# Altium footprint library ICs And Semiconductors SMD_BGA.PcbLib: 118 footprints (part 2 of 17)
Each footprint in its own frame and in the unit in brackets; x right, y up, seen from the top. Pads: shape width x height; smd on the part's side, far side on the other; paste and mask are expansions set on the pad; w line width, h text height; cw(c..) or ccw(c..) is an arc to the next point about the centre after c.
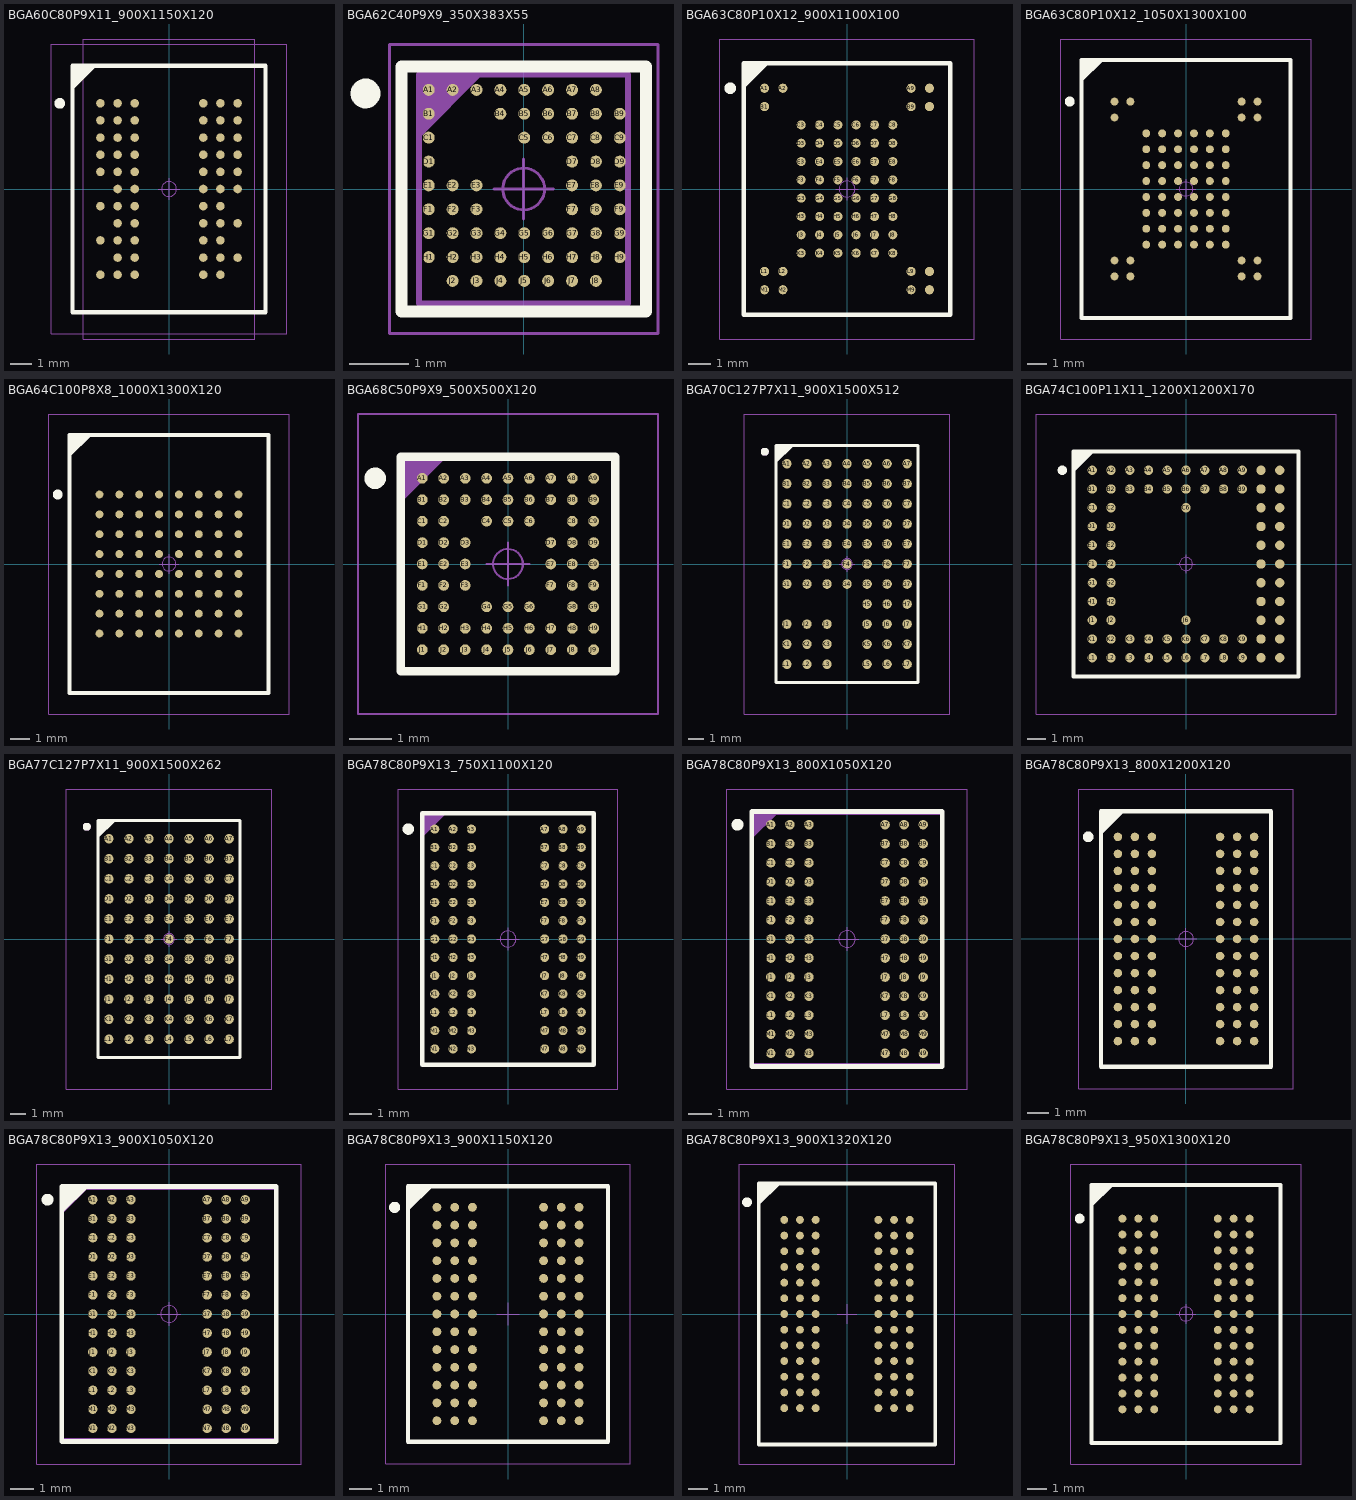
[diagram p1: the footprints below, top view; thin cyan lines are the x and y axes]

## BGA60C80P9X11_900X1150X120 [mm] "BGA, 0.80mm pitch, Rect.; 60 Pin, 9 Columns X 11 Rows, 9.00mm X 11.50mm X 1.20mm H"
height 1.2
pads (60):
  round 0.4 smd: A1(-3.2,4) A2(-2.4,4) A3(-1.6,4) A7(1.6,4) A8(2.4,4) A9(3.2,4) B1(-3.2,3.2) B2(-2.4,3.2) B3(-1.6,3.2) B7(1.6,3.2) B8(2.4,3.2) B9(3.2,3.2) C1(-3.2,2.4) C2(-2.4,2.4) C3(-1.6,2.4) C7(1.6,2.4) C8(2.4,2.4) C9(3.2,2.4) D1(-3.2,1.6) D2(-2.4,1.6) D3(-1.6,1.6) D7(1.6,1.6) D8(2.4,1.6) D9(3.2,1.6) E1(-3.2,0.8) E2(-2.4,0.8) E3(-1.6,0.8) E7(1.6,0.8) E8(2.4,0.8) E9(3.2,0.8) F2(-2.4,0) F3(-1.6,0) F7(1.6,0) F8(2.4,0) F9(3.2,0) G1(-3.2,-0.8) G2(-2.4,-0.8) G3(-1.6,-0.8) G7(1.6,-0.8) G8(2.4,-0.8) H2(-2.4,-1.6) H3(-1.6,-1.6) H7(1.6,-1.6) H8(2.4,-1.6) H9(3.2,-1.6) J1(-3.2,-2.4) J2(-2.4,-2.4) J3(-1.6,-2.4) J7(1.6,-2.4) J8(2.4,-2.4) K2(-2.4,-3.2) K3(-1.6,-3.2) K7(1.6,-3.2) K8(2.4,-3.2) K9(3.2,-3.2) L1(-3.2,-4) L2(-2.4,-4) L3(-1.6,-4) L7(1.6,-4) L8(2.4,-4)
Top Overlay:
  circle w0.25: c-5.1,3.998 r0.125
  lines w0.2: -4.5,4.748 -3.5,5.748 ; -4.5,4.948 -3.7,5.748 ; -4.5,5.148 -3.9,5.748 ; -4.5,5.348 -4.1,5.748 ; -4.5,5.548 -4.3,5.748 ; -4.5,-5.752 4.5,-5.752 4.5,5.748 -4.5,5.748 -4.5,-5.752
Mechanical 14:
  lines w0.1: -4.5,4.748 -3.5,5.748 ; -4.5,4.848 -3.6,5.748 ; -4.5,4.948 -3.7,5.748 ; -4.5,5.048 -3.8,5.748 ; -4.5,5.148 -3.9,5.748 ; -4.5,5.248 -4,5.748 ; -4.5,5.348 -4.1,5.748 ; -4.5,5.448 -4.2,5.748 ; -4.5,5.548 -4.3,5.748 ; -4.5,5.648 -4.4,5.748 ; -4.5,-5.752 4.5,-5.752 4.5,5.748 -4.5,5.748 -4.5,-5.752
  text "9" at 3.175,6.025 h0.4
  text "8" at 2.375,6.025 h0.4
  text "7" at 1.575,6.025 h0.4
  text "3" at -1.625,6.025 h0.4
  text "2" at -2.425,6.025 h0.4
  text "1" at -3.225,6.025 h0.4
  text "J" at -5.2,-2.425 h0.4
  text "B" at -5.2,3.175 h0.4
  text "C" at -5.2,2.375 h0.4
  text "D" at -5.2,1.575 h0.4
  text "E" at -5.2,0.775 h0.4
  text "F" at -5.2,-0.025 h0.4
  text "G" at -5.2,-0.825 h0.4
  text "H" at -5.2,-1.625 h0.4
  text "K" at -5.2,-3.225 h0.4
  text "L" at -5.2,-4.025 h0.4
  text "A" at -5.2,3.975 h0.4
Mechanical 15:
  circle w0.05: c0,-0.002 r0.35
  lines w0.05: -0.5,-0.002 0.5,-0.002 ; 0,-0.502 0,0.498 ; -5.5,-6.752 5.5,-6.752 5.5,6.748 -5.5,6.748 -5.5,-6.752
Mechanical 21:
  lines w0.001: -4,-7 -4,7 4,7 4,-7 -4,-7
3D body "BGA60C80P9X11_900X1150X120.stp": height 1.2, standoff 0, extent -4.5,-5.75 4.5,5.75

## BGA62C40P9X9_350X383X55 [mm] "BGA, 0.40mm Pitch, Rect.; 62 Pin, 9 Columns X 9 Rows, 3.50mm X 3.83mm X 0.55mm H"
height 0.55
pads (62):
  round 0.2 smd: A1(-1.59,1.66) A2(-1.19,1.66) A3(-0.79,1.66) A4(-0.39,1.66) A5(0.01,1.66) A6(0.41,1.66) A7(0.81,1.66) A8(1.21,1.66) B1(-1.59,1.26) B4(-0.39,1.26) B5(0.01,1.26) B6(0.41,1.26) B7(0.81,1.26) B8(1.21,1.26) B9(1.61,1.26) C1(-1.59,0.86) C5(0.01,0.86) C6(0.41,0.86) C7(0.81,0.86) C8(1.21,0.86) C9(1.61,0.86) D1(-1.59,0.46) D7(0.81,0.46) D8(1.21,0.46) D9(1.61,0.46) E1(-1.59,0.06) E2(-1.19,0.06) E3(-0.79,0.06) E7(0.81,0.06) E8(1.21,0.06) E9(1.61,0.06) F1(-1.59,-0.34) F2(-1.19,-0.34) F3(-0.79,-0.34) F7(0.81,-0.34) F8(1.21,-0.34) F9(1.61,-0.34) G1(-1.59,-0.74) G2(-1.19,-0.74) G3(-0.79,-0.74) G4(-0.39,-0.74) G5(0.01,-0.74) G6(0.41,-0.74) G7(0.81,-0.74) G8(1.21,-0.74) G9(1.61,-0.74) H1(-1.59,-1.14) H2(-1.19,-1.14) H3(-0.79,-1.14) H4(-0.39,-1.14) H5(0.01,-1.14) H6(0.41,-1.14) H7(0.81,-1.14) H8(1.21,-1.14) H9(1.61,-1.14) J2(-1.19,-1.54) J3(-0.79,-1.54) J4(-0.39,-1.54) J5(0.01,-1.54) J6(0.41,-1.54) J7(0.81,-1.54) J8(1.21,-1.54)
Top Overlay:
  circle w0.25: c-2.65,1.6 r0.125
  lines w0.2: -2.05,-2.05 2.05,-2.05 2.05,2.05 -2.05,2.05 -2.05,-2.05
Mechanical 14:
  lines w0.1: -1.75,0.92 -0.75,1.92 ; -1.75,1.02 -0.85,1.92 ; -1.75,1.12 -0.95,1.92 ; -1.75,1.22 -1.05,1.92 ; -1.75,1.32 -1.15,1.92 ; -1.75,1.42 -1.25,1.92 ; -1.75,1.52 -1.35,1.92 ; -1.75,1.62 -1.45,1.92 ; -1.75,1.72 -1.55,1.92 ; -1.75,1.82 -1.65,1.92 ; -1.75,-1.915 -1.75,1.915 1.75,1.915 1.75,-1.915 -1.75,-1.915
Mechanical 15:
  circle w0.05: c0,0 r0.35
  lines w0.05: -0.5,0 0.5,0 ; 0,-0.5 0,0.5 ; -2.25,-2.42 -2.25,2.42 2.25,2.42 2.25,-2.42 -2.25,-2.42
3D body "BGA62C40P9X9_350X383X55.stp": height 0.55, standoff 0, extent -1.775,-1.94 1.775,1.94

## BGA63C80P10X12_900X1100X100 [mm] "BGA, 0.80mm pitch, Rect.; 63 Pin, 10 Columns X 12 Rows, 9.00mm X 11.00mm X 1.00mm H"
height 1
pads (63):
  round 0.4 smd: A1(-3.6,4.4) A2(-2.8,4.4) A9(2.8,4.4) A10(3.6,4.4) B1(-3.6,3.6) B9(2.8,3.6) B10(3.6,3.6) C3(-2,2.8) C4(-1.2,2.8) C5(-0.4,2.8) C6(0.4,2.8) C7(1.2,2.8) C8(2,2.8) D3(-2,2) D4(-1.2,2) D5(-0.4,2) D6(0.4,2) D7(1.2,2) D8(2,2) E3(-2,1.2) E4(-1.2,1.2) E5(-0.4,1.2) E6(0.4,1.2) E7(1.2,1.2) E8(2,1.2) F3(-2,0.4) F4(-1.2,0.4) F5(-0.4,0.4) F6(0.4,0.4) F7(1.2,0.4) F8(2,0.4) G3(-2,-0.4) G4(-1.2,-0.4) G5(-0.4,-0.4) G6(0.4,-0.4) G7(1.2,-0.4) G8(2,-0.4) H3(-2,-1.2) H4(-1.2,-1.2) H5(-0.4,-1.2) H6(0.4,-1.2) H7(1.2,-1.2) H8(2,-1.2) J3(-2,-2) J4(-1.2,-2) J5(-0.4,-2) J6(0.4,-2) J7(1.2,-2) J8(2,-2) K3(-2,-2.8) K4(-1.2,-2.8) K5(-0.4,-2.8) K6(0.4,-2.8) K7(1.2,-2.8) K8(2,-2.8) L1(-3.6,-3.6) L2(-2.8,-3.6) L9(2.8,-3.6) L10(3.6,-3.6) M1(-3.6,-4.4) M2(-2.8,-4.4) M9(2.8,-4.4) M10(3.6,-4.4)
Top Overlay:
  circle w0.25: c-5.1,4.4 r0.125
  lines w0.2: -4.5,4.5 -3.5,5.5 ; -4.5,4.7 -3.7,5.5 ; -4.5,4.9 -3.9,5.5 ; -4.5,5.1 -4.1,5.5 ; -4.5,5.3 -4.3,5.5 ; -4.5,-5.5 4.5,-5.5 4.5,5.5 -4.5,5.5 -4.5,-5.5
Mechanical 14:
  lines w0.1: -4.5,4.5 -3.5,5.5 ; -4.5,4.6 -3.6,5.5 ; -4.5,4.7 -3.7,5.5 ; -4.5,4.8 -3.8,5.5 ; -4.5,4.9 -3.9,5.5 ; -4.5,5 -4,5.5 ; -4.5,5.1 -4.1,5.5 ; -4.5,5.2 -4.2,5.5 ; -4.5,5.3 -4.3,5.5 ; -4.5,5.4 -4.4,5.5 ; -4.5,-5.5 4.5,-5.5 4.5,5.5 -4.5,5.5 -4.5,-5.5
Mechanical 15:
  circle w0.05: c0,0 r0.35
  lines w0.05: -0.5,0 0.5,0 ; 0,-0.5 0,0.5 ; -5.55,-6.55 5.55,-6.55 5.55,6.55 -5.55,6.55 -5.55,-6.55
3D body "BGA63C80P10X12_900X1100X100.stp": height 1, standoff 0, extent -4.5,-5.5 4.5,5.5

## BGA63C80P10X12_1050X1300X100 [mm] "BGA, 0.80mm pitch, Rect.; 63 Pin, 10 Columns X 12 Rows, 10.50mm X 13.00mm X 1.00mm H"
height 1
pads (63):
  round 0.4 smd: A1(-3.6,4.4) A2(-2.8,4.4) A9(2.8,4.4) A10(3.6,4.4) B1(-3.6,3.6) B9(2.8,3.6) B10(3.6,3.6) C3(-2,2.8) C4(-1.2,2.8) C5(-0.4,2.8) C6(0.4,2.8) C7(1.2,2.8) C8(2,2.8) D3(-2,2) D4(-1.2,2) D5(-0.4,2) D6(0.4,2) D7(1.2,2) D8(2,2) E3(-2,1.2) E4(-1.2,1.2) E5(-0.4,1.2) E6(0.4,1.2) E7(1.2,1.2) E8(2,1.2) F3(-2,0.4) F4(-1.2,0.4) F5(-0.4,0.4) F6(0.4,0.4) F7(1.2,0.4) F8(2,0.4) G3(-2,-0.4) G4(-1.2,-0.4) G5(-0.4,-0.4) G6(0.4,-0.4) G7(1.2,-0.4) G8(2,-0.4) H3(-2,-1.2) H4(-1.2,-1.2) H5(-0.4,-1.2) H6(0.4,-1.2) H7(1.2,-1.2) H8(2,-1.2) J3(-2,-2) J4(-1.2,-2) J5(-0.4,-2) J6(0.4,-2) J7(1.2,-2) J8(2,-2) K3(-2,-2.8) K4(-1.2,-2.8) K5(-0.4,-2.8) K6(0.4,-2.8) K7(1.2,-2.8) K8(2,-2.8) L1(-3.6,-3.6) L2(-2.8,-3.6) L9(2.8,-3.6) L10(3.6,-3.6) M1(-3.6,-4.4) M2(-2.8,-4.4) M9(2.8,-4.4) M10(3.6,-4.4)
Top Overlay:
  circle w0.25: c-5.85,4.4 r0.125
  lines w0.2: -5.25,5.5 -4.25,6.5 ; -5.25,5.7 -4.45,6.5 ; -5.25,5.9 -4.65,6.5 ; -5.25,6.1 -4.85,6.5 ; -5.25,6.3 -5.05,6.5 ; -5.25,-6.5 5.25,-6.5 5.25,6.5 -5.25,6.5 -5.25,-6.5
Mechanical 14:
  lines w0.1: -5.25,5.5 -4.25,6.5 ; -5.25,5.6 -4.35,6.5 ; -5.25,5.7 -4.45,6.5 ; -5.25,5.8 -4.55,6.5 ; -5.25,5.9 -4.65,6.5 ; -5.25,6 -4.75,6.5 ; -5.25,6.1 -4.85,6.5 ; -5.25,6.2 -4.95,6.5 ; -5.25,6.3 -5.05,6.5 ; -5.25,6.4 -5.15,6.5 ; -5.25,-6.5 5.25,-6.5 5.25,6.5 -5.25,6.5 -5.25,-6.5
Mechanical 15:
  circle w0.05: c0,0 r0.35
  lines w0.05: -0.5,0 0.5,0 ; 0,-0.5 0,0.5 ; -6.3,-7.55 6.3,-7.55 6.3,7.55 -6.3,7.55 -6.3,-7.55
3D body "BGA63C80P10X12_1050X1300X100.stp": height 1, standoff 0, extent -5.25,-6.5 5.25,6.5

## BGA64C100P8X8_1000X1300X120 [mm] "BGA, 1.00mm Pitch, Rect.; 64 Pin, 8 Columns X 8 Rows, 10.00mm X 13.00mm X 1.20mm H"
height 1.2
pads (64):
  round 0.4 smd: A1(-3.5,3.5) A2(-2.5,3.5) A3(-1.5,3.5) A4(-0.5,3.5) A5(0.5,3.5) A6(1.5,3.5) A7(2.5,3.5) A8(3.5,3.5) B1(-3.5,2.5) B2(-2.5,2.5) B3(-1.5,2.5) B4(-0.5,2.5) B5(0.5,2.5) B6(1.5,2.5) B7(2.5,2.5) B8(3.5,2.5) C1(-3.5,1.5) C2(-2.5,1.5) C3(-1.5,1.5) C4(-0.5,1.5) C5(0.5,1.5) C6(1.5,1.5) C7(2.5,1.5) C8(3.5,1.5) D1(-3.5,0.5) D2(-2.5,0.5) D3(-1.5,0.5) D4(-0.5,0.5) D5(0.5,0.5) D6(1.5,0.5) D7(2.5,0.5) D8(3.5,0.5) E1(-3.5,-0.5) E2(-2.5,-0.5) E3(-1.5,-0.5) E4(-0.5,-0.5) E5(0.5,-0.5) E6(1.5,-0.5) E7(2.5,-0.5) E8(3.5,-0.5) F1(-3.5,-1.5) F2(-2.5,-1.5) F3(-1.5,-1.5) F4(-0.5,-1.5) F5(0.5,-1.5) F6(1.5,-1.5) F7(2.5,-1.5) F8(3.5,-1.5) G1(-3.5,-2.5) G2(-2.5,-2.5) G3(-1.5,-2.5) G4(-0.5,-2.5) G5(0.5,-2.5) G6(1.5,-2.5) G7(2.5,-2.5) G8(3.5,-2.5) H1(-3.5,-3.5) H2(-2.5,-3.5) H3(-1.5,-3.5) H4(-0.5,-3.5) H5(0.5,-3.5) H6(1.5,-3.5) H7(2.5,-3.5) H8(3.5,-3.5)
Top Overlay:
  circle w0.25: c-5.6,3.5 r0.125
  lines w0.2: -5,5.5 -4,6.5 ; -5,5.7 -4.2,6.5 ; -5,5.9 -4.4,6.5 ; -5,6.1 -4.6,6.5 ; -5,6.3 -4.8,6.5 ; -5,-6.5 5,-6.5 5,6.5 -5,6.5 -5,-6.5
Mechanical 14:
  lines w0.1: -5,5.5 -4,6.5 ; -5,5.6 -4.1,6.5 ; -5,5.7 -4.2,6.5 ; -5,5.8 -4.3,6.5 ; -5,5.9 -4.4,6.5 ; -5,6 -4.5,6.5 ; -5,6.1 -4.6,6.5 ; -5,6.2 -4.7,6.5 ; -5,6.3 -4.8,6.5 ; -5,6.4 -4.9,6.5 ; -5,-6.5 5,-6.5 5,6.5 -5,6.5 -5,-6.5
Mechanical 15:
  circle w0.05: c0,0 r0.35
  lines w0.05: -0.5,0 0.5,0 ; 0,-0.5 0,0.5 ; -6.05,-7.55 6.05,-7.55 6.05,7.55 -6.05,7.55 -6.05,-7.55
3D body "BGA64C100P8X8_1000X1300X120.stp": height 1.2, standoff 0, extent -5,-6.5 5,6.5

## BGA68C50P9X9_500X500X120 [mm] "BGA, 0.50mm Pitch, Square; 68 Pin, 9 Columns X 9 Rows, 5.00mm X 5.00mm X 1.20mm H"
height 1.2
pads (68):
  round 0.25 smd: A1(-2,2) A2(-1.5,2) A3(-1,2) A4(-0.5,2) A5(0,2) A6(0.5,2) A7(1,2) A8(1.5,2) A9(2,2) B1(-2,1.5) B2(-1.5,1.5) B3(-1,1.5) B4(-0.5,1.5) B5(0,1.5) B6(0.5,1.5) B7(1,1.5) B8(1.5,1.5) B9(2,1.5) C1(-2,1) C2(-1.5,1) C4(-0.5,1) C5(0,1) C6(0.5,1) C8(1.5,1) C9(2,1) D1(-2,0.5) D2(-1.5,0.5) D3(-1,0.5) D7(1,0.5) D8(1.5,0.5) D9(2,0.5) E1(-2,0) E2(-1.5,0) E3(-1,0) E7(1,0) E8(1.5,0) E9(2,0) F1(-2,-0.5) F2(-1.5,-0.5) F3(-1,-0.5) F7(1,-0.5) F8(1.5,-0.5) F9(2,-0.5) G1(-2,-1) G2(-1.5,-1) G4(-0.5,-1) G5(0,-1) G6(0.5,-1) G8(1.5,-1) G9(2,-1) H1(-2,-1.5) H2(-1.5,-1.5) H3(-1,-1.5) H4(-0.5,-1.5) H5(0,-1.5) H6(0.5,-1.5) H7(1,-1.5) H8(1.5,-1.5) H9(2,-1.5) J1(-2,-2) J2(-1.5,-2) J3(-1,-2) J4(-0.5,-2) J5(0,-2) J6(0.5,-2) J7(1,-2) J8(1.5,-2) J9(2,-2)
Top Overlay:
  circle w0.25: c-3.1,2 r0.125
  lines w0.2: -2.5,-2.5 -2.5,2.5 2.5,2.5 2.5,-2.5 -2.5,-2.5
Mechanical 14:
  lines w0.1: -2.5,1.5 -1.5,2.5 ; -2.5,1.6 -1.6,2.5 ; -2.5,1.7 -1.7,2.5 ; -2.5,1.8 -1.8,2.5 ; -2.5,1.9 -1.9,2.5 ; -2.5,2 -2,2.5 ; -2.5,2.1 -2.1,2.5 ; -2.5,2.2 -2.2,2.5 ; -2.5,2.3 -2.3,2.5 ; -2.5,2.4 -2.4,2.5 ; -2.5,-2.5 -2.5,2.5 2.5,2.5 2.5,-2.5 -2.5,-2.5
  text "9" at 1.9,2.8 h0.4
  text "1" at -2.1,2.8 h0.4
  text "J" at -3,-2.2 h0.4
  text "A" at -3.2,2.5 h0.4
Mechanical 15:
  circle w0.05: c0,0 r0.35
  lines w0.05: -0.5,0 0.5,0 ; 0,-0.5 0,0.5 ; -3.5,-3.5 -3.5,3.5 3.5,3.5 3.5,-3.5 -3.5,-3.5
3D body "BGA68C50P9X9_500X500X120.stp": height 1.15, standoff 0, extent -2.5,-2.5 2.5,2.5

## BGA70C127P7X11_900X1500X512 [mm] "BGA, 1.27mm Pitch, Rect.; 70 Pin, 7 Columns X 11 Rows,9.00mm X 15.00mm X 5.12mm H"
height 5.12
pads (70):
  round 0.6 smd: A1(-3.81,6.35) A2(-2.54,6.35) A3(-1.27,6.35) A4(0,6.35) A5(1.27,6.35) A6(2.54,6.35) A7(3.81,6.35) B1(-3.81,5.08) B2(-2.54,5.08) B3(-1.27,5.08) B4(0,5.08) B5(1.27,5.08) B6(2.54,5.08) B7(3.81,5.08) C1(-3.81,3.81) C2(-2.54,3.81) C3(-1.27,3.81) C4(0,3.81) C5(1.27,3.81) C6(2.54,3.81) C7(3.81,3.81) D1(-3.81,2.54) D2(-2.54,2.54) D3(-1.27,2.54) D4(0,2.54) D5(1.27,2.54) D6(2.54,2.54) D7(3.81,2.54) E1(-3.81,1.27) E2(-2.54,1.27) E3(-1.27,1.27) E4(0,1.27) E5(1.27,1.27) E6(2.54,1.27) E7(3.81,1.27) F1(-3.81,0) F2(-2.54,0) F3(-1.27,0) F4(0,0) F5(1.27,0) F6(2.54,0) F7(3.81,0) G1(-3.81,-1.27) G2(-2.54,-1.27) G3(-1.27,-1.27) G4(0,-1.27) G5(1.27,-1.27) G6(2.54,-1.27) G7(3.81,-1.27) H5(1.27,-2.54) H6(2.54,-2.54) H7(3.81,-2.54) J1(-3.81,-3.81) J2(-2.54,-3.81) J3(-1.27,-3.81) J5(1.27,-3.81) J6(2.54,-3.81) J7(3.81,-3.81) K1(-3.81,-5.08) K2(-2.54,-5.08) K3(-1.27,-5.08) K5(1.27,-5.08) K6(2.54,-5.08) K7(3.81,-5.08) L1(-3.81,-6.35) L2(-2.54,-6.35) L3(-1.27,-6.35) L5(1.27,-6.35) L6(2.54,-6.35) L7(3.81,-6.35)
Top Overlay:
  circle w0.25: c-5.205,7.112 r0.125
  lines w0.2: -4.5,6.5 -3.5,7.5 ; -4.5,6.7 -3.7,7.5 ; -4.5,6.9 -3.9,7.5 ; -4.5,7.1 -4.1,7.5 ; -4.5,7.3 -4.3,7.5 ; -4.5,-7.5 -4.5,7.5 4.5,7.5 4.5,-7.5 -4.5,-7.5
Mechanical 14:
  circle w0.25: c-5.205,7.112 r0.125
  lines w0.1: -4.5,6.5 -3.5,7.5 ; -4.5,6.6 -3.6,7.5 ; -4.5,6.7 -3.7,7.5 ; -4.5,6.8 -3.8,7.5 ; -4.5,6.9 -3.9,7.5 ; -4.5,7 -4,7.5 ; -4.5,7.1 -4.1,7.5 ; -4.5,7.2 -4.2,7.5 ; -4.5,7.3 -4.3,7.5 ; -4.5,7.4 -4.4,7.5 ; -4.5,-7.5 -4.5,7.5 4.5,7.5 4.5,-7.5 -4.5,-7.5
  text "6" at 2.413,7.874 h0.4
  text "5" at 1.143,7.874 h0.4
  text "4" at -0.127,7.874 h0.4
  text "7" at 3.683,7.874 h0.4
  text "3" at -1.397,7.874 h0.4
  text "2" at -2.667,7.874 h0.4
  text "1" at -3.937,7.874 h0.4
  text "J" at -5.08,-3.937 h0.4
  text "A" at -5.08,6.223 h0.4
  text "B" at -5.08,4.953 h0.4
  text "C" at -5.08,3.683 h0.4
  text "D" at -5.08,2.413 h0.4
  text "E" at -5.08,1.143 h0.4
  text "F" at -5.08,-0.127 h0.4
  text "G" at -5.08,-1.397 h0.4
  text "H" at -5.08,-2.667 h0.4
  text "K" at -5.08,-5.207 h0.4
  text "L" at -5.08,-6.477 h0.4
Mechanical 15:
  circle w0.05: c0,0 r0.35
  lines w0.05: -0.5,0 0.5,0 ; 0,-0.5 0,0.5 ; -6.5,-9.5 -6.5,9.5 6.5,9.5 6.5,-9.5 -6.5,-9.5
3D body "BGA70C127P7X11_900X1500X512.stp": height 5.12, standoff 0, extent -4.5,-7.5 4.5,7.5

## BGA74C100P11X11_1200X1200X170 [mm] "BGA, 1.00mm Pitch, Square; 74 Pin, 11 Columns X 11 Rows, 12.00mm X 12.00mm X 1.70mm H"
height 1.7
pads (74):
  round 0.5 smd: A1(-5,5) A2(-4,5) A3(-3,5) A4(-2,5) A5(-1,5) A6(0,5) A7(1,5) A8(2,5) A9(3,5) A10(4,5) A11(5,5) B1(-5,4) B2(-4,4) B3(-3,4) B4(-2,4) B5(-1,4) B6(0,4) B7(1,4) B8(2,4) B9(3,4) B10(4,4) B11(5,4) C1(-5,3) C2(-4,3) C6(0,3) C10(4,3) C11(5,3) D1(-5,2) D2(-4,2) D10(4,2) D11(5,2) E1(-5,1) E2(-4,1) E10(4,1) E11(5,1) F1(-5,0) F2(-4,0) F10(4,0) F11(5,0) G1(-5,-1) G2(-4,-1) G10(4,-1) G11(5,-1) H1(-5,-2) H2(-4,-2) H10(4,-2) H11(5,-2) J1(-5,-3) J2(-4,-3) J6(0,-3) J10(4,-3) J11(5,-3) K1(-5,-4) K2(-4,-4) K3(-3,-4) K4(-2,-4) K5(-1,-4) K6(0,-4) K7(1,-4) K8(2,-4) K9(3,-4) K10(4,-4) K11(5,-4) L1(-5,-5) L2(-4,-5) L3(-3,-5) L4(-2,-5) L5(-1,-5) L6(0,-5) L7(1,-5) L8(2,-5) L9(3,-5) L10(4,-5) L11(5,-5)
Top Overlay:
  circle w0.25: c-6.6,5 r0.125
  lines w0.2: -6,5 -5,6 ; -6,5.2 -5.2,6 ; -6,5.4 -5.4,6 ; -6,5.6 -5.6,6 ; -6,5.8 -5.8,6 ; -6,-6 -6,6 6,6 6,-6 -6,-6
Mechanical 14:
  text "L" at -6.9,-5.3 h0.6
  text "K" at -6.9,-4.3 h0.6
  text "J" at -6.9,-3.3 h0.6
  text "H" at -6.9,-2.3 h0.6
  text "G" at -6.9,-1.3 h0.6
  text "F" at -6.9,-0.3 h0.6
  text "E" at -6.9,0.7 h0.6
  text "D" at -6.9,1.7 h0.6
  text "C" at -6.9,2.7 h0.6
  text "B" at -6.9,3.7 h0.6
  text "A" at -6.9,4.7 h0.6
  text "2" at -3.625,6.5 h0.6
  text "3" at -2.625,6.5 h0.6
  text "4" at -1.625,6.5 h0.6
  text "5" at -0.625,6.5 h0.6
  text "11" at 5.275,6.5 h0.6
  text "10" at 4.225,6.5 h0.6
  text "9" at 3.425,6.5 h0.6
  text "8" at 2.35,6.5 h0.6
  text "7" at 1.375,6.5 h0.6
  text "6" at 0.375,6.5 h0.6
  text "1" at -4.575,6.5 h0.6
Mechanical 15:
  circle w0.05: c0,0 r0.35
  lines w0.05: -0.5,0 0.5,0 ; 0,-0.5 0,0.5 ; -8,-8 -8,8 8,8 8,-8 -8,-8
  lines w0.1: -6,5 -5,6 ; -6,5.1 -5.1,6 ; -6,5.2 -5.2,6 ; -6,5.3 -5.3,6 ; -6,5.4 -5.4,6 ; -6,5.5 -5.5,6 ; -6,5.6 -5.6,6 ; -6,5.7 -5.7,6 ; -6,5.8 -5.8,6 ; -6,5.9 -5.9,6 ; -6,-6 -6,6 6,6 6,-6 -6,-6
3D body "BGA74C100P11X11_1200X1200X170.stp": height 1.7, standoff 0, extent -6,-6 6,6

## BGA77C127P7X11_900X1500X262 [mm] "BGA, 1.27mm Pitch, Rect.; 77 Pin, 7 Columns X 11 Rows, 9.00mm X 15.00mm X 2.62mm H"
height 2.62
pads (77):
  round 0.6 smd: A1(-3.81,6.35) A2(-2.54,6.35) A3(-1.27,6.35) A4(0,6.35) A5(1.27,6.35) A6(2.54,6.35) A7(3.81,6.35) B1(-3.81,5.08) B2(-2.54,5.08) B3(-1.27,5.08) B4(0,5.08) B5(1.27,5.08) B6(2.54,5.08) B7(3.81,5.08) C1(-3.81,3.81) C2(-2.54,3.81) C3(-1.27,3.81) C4(0,3.81) C5(1.27,3.81) C6(2.54,3.81) C7(3.81,3.81) D1(-3.81,2.54) D2(-2.54,2.54) D3(-1.27,2.54) D4(0,2.54) D5(1.27,2.54) D6(2.54,2.54) D7(3.81,2.54) E1(-3.81,1.27) E2(-2.54,1.27) E3(-1.27,1.27) E4(0,1.27) E5(1.27,1.27) E6(2.54,1.27) E7(3.81,1.27) F1(-3.81,0) F2(-2.54,0) F3(-1.27,0) F4(0,0) F5(1.27,0) F6(2.54,0) F7(3.81,0) G1(-3.81,-1.27) G2(-2.54,-1.27) G3(-1.27,-1.27) G4(0,-1.27) G5(1.27,-1.27) G6(2.54,-1.27) G7(3.81,-1.27) H1(-3.81,-2.54) H2(-2.54,-2.54) H3(-1.27,-2.54) H4(0,-2.54) H5(1.27,-2.54) H6(2.54,-2.54) H7(3.81,-2.54) J1(-3.81,-3.81) J2(-2.54,-3.81) J3(-1.27,-3.81) J4(0,-3.81) J5(1.27,-3.81) J6(2.54,-3.81) J7(3.81,-3.81) K1(-3.81,-5.08) K2(-2.54,-5.08) K3(-1.27,-5.08) K4(0,-5.08) K5(1.27,-5.08) K6(2.54,-5.08) K7(3.81,-5.08) L1(-3.81,-6.35) L2(-2.54,-6.35) L3(-1.27,-6.35) L4(0,-6.35) L5(1.27,-6.35) L6(2.54,-6.35) L7(3.81,-6.35)
Top Overlay:
  circle w0.25: c-5.205,7.112 r0.125
  lines w0.2: -4.5,6.5 -3.5,7.5 ; -4.5,6.7 -3.7,7.5 ; -4.5,6.9 -3.9,7.5 ; -4.5,7.1 -4.1,7.5 ; -4.5,7.3 -4.3,7.5 ; -4.5,-7.5 4.5,-7.5 4.5,7.5 -4.5,7.5 -4.5,-7.5
Mechanical 14:
  circle w0.25: c-5.205,7.112 r0.125
  lines w0.1: -4.5,6.5 -3.5,7.5 ; -4.5,6.6 -3.6,7.5 ; -4.5,6.7 -3.7,7.5 ; -4.5,6.8 -3.8,7.5 ; -4.5,6.9 -3.9,7.5 ; -4.5,7 -4,7.5 ; -4.5,7.1 -4.1,7.5 ; -4.5,7.2 -4.2,7.5 ; -4.5,7.3 -4.3,7.5 ; -4.5,7.4 -4.4,7.5 ; -4.5,-7.5 4.5,-7.5 4.5,7.5 -4.5,7.5 -4.5,-7.5
  text "L" at -5.08,-6.477 h0.4
  text "K" at -5.08,-5.207 h0.4
  text "H" at -5.08,-2.667 h0.4
  text "G" at -5.08,-1.397 h0.4
  text "F" at -5.08,-0.127 h0.4
  text "E" at -5.08,1.143 h0.4
  text "D" at -5.08,2.413 h0.4
  text "C" at -5.08,3.683 h0.4
  text "B" at -5.08,4.953 h0.4
  text "A" at -5.08,6.223 h0.4
  text "J" at -5.08,-3.937 h0.4
  text "1" at -3.937,7.874 h0.4
  text "2" at -2.667,7.874 h0.4
  text "3" at -1.397,7.874 h0.4
  text "7" at 3.683,7.874 h0.4
  text "4" at -0.127,7.874 h0.4
  text "5" at 1.143,7.874 h0.4
  text "6" at 2.413,7.874 h0.4
Mechanical 15:
  circle w0.05: c0,0 r0.35
  lines w0.05: -0.5,0 0.5,0 ; 0,-0.5 0,0.5 ; -6.5,-9.5 6.5,-9.5 6.5,9.5 -6.5,9.5 -6.5,-9.5
3D body "BGA77C127P7X11_900X1500X262.stp": height 2.62, standoff 0, extent -4.5,-7.5 4.5,7.5

## BGA78C80P9X13_750X1100X120 [mm] "BGA, 0.80mm Pitch, Rect.; 78 Pin, 9 Columns X 13 Rows, 7.50mm X 11.00mm X 1.20mm H"
height 1.2
pads (78):
  round 0.4 smd: A1(-3.2,4.8) A2(-2.4,4.8) A3(-1.6,4.8) A7(1.6,4.8) A8(2.4,4.8) A9(3.2,4.8) B1(-3.2,4) B2(-2.4,4) B3(-1.6,4) B7(1.6,4) B8(2.4,4) B9(3.2,4) C1(-3.2,3.2) C2(-2.4,3.2) C3(-1.6,3.2) C7(1.6,3.2) C8(2.4,3.2) C9(3.2,3.2) D1(-3.2,2.4) D2(-2.4,2.4) D3(-1.6,2.4) D7(1.6,2.4) D8(2.4,2.4) D9(3.2,2.4) E1(-3.2,1.6) E2(-2.4,1.6) E3(-1.6,1.6) E7(1.6,1.6) E8(2.4,1.6) E9(3.2,1.6) F1(-3.2,0.8) F2(-2.4,0.8) F3(-1.6,0.8) F7(1.6,0.8) F8(2.4,0.8) F9(3.2,0.8) G1(-3.2,0) G2(-2.4,0) G3(-1.6,0) G7(1.6,0) G8(2.4,0) G9(3.2,0) H1(-3.2,-0.8) H2(-2.4,-0.8) H3(-1.6,-0.8) H7(1.6,-0.8) H8(2.4,-0.8) H9(3.2,-0.8) J1(-3.2,-1.6) J2(-2.4,-1.6) J3(-1.6,-1.6) J7(1.6,-1.6) J8(2.4,-1.6) J9(3.2,-1.6) K1(-3.2,-2.4) K2(-2.4,-2.4) K3(-1.6,-2.4) K7(1.6,-2.4) K8(2.4,-2.4) K9(3.2,-2.4) L1(-3.2,-3.2) L2(-2.4,-3.2) L3(-1.6,-3.2) L7(1.6,-3.2) L8(2.4,-3.2) L9(3.2,-3.2) M1(-3.2,-4) M2(-2.4,-4) M3(-1.6,-4) M7(1.6,-4) M8(2.4,-4) M9(3.2,-4) N1(-3.2,-4.8) N2(-2.4,-4.8) N3(-1.6,-4.8) N7(1.6,-4.8) N8(2.4,-4.8) N9(3.2,-4.8)
Top Overlay:
  circle w0.25: c-4.35,4.8 r0.125
  lines w0.001: -3.75,-5.5 -3.75,5.5 3.75,5.5 3.75,-5.5 -3.75,-5.5
  lines w0.2: -3.75,-5.5 -3.75,5.5 3.75,5.5 3.75,-5.5 -3.75,-5.5
Mechanical 14:
  lines w0.1: -3.75,4.5 -2.75,5.5 ; -3.75,4.6 -2.85,5.5 ; -3.75,4.7 -2.95,5.5 ; -3.75,4.8 -3.05,5.5 ; -3.75,4.9 -3.15,5.5 ; -3.75,5 -3.25,5.5 ; -3.75,5.1 -3.35,5.5 ; -3.75,5.2 -3.45,5.5 ; -3.75,5.3 -3.55,5.5 ; -3.75,5.4 -3.65,5.5 ; -3.75,-5.5 -3.75,5.5 3.75,5.5 3.75,-5.5 -3.75,-5.5
Mechanical 15:
  circle w0.05: c0,0 r0.35
  lines w0.05: -0.5,0 0.5,0 ; 0,-0.5 0,0.5 ; -4.8,-6.55 -4.8,6.55 4.8,6.55 4.8,-6.55 -4.8,-6.55
3D body "BGA78C80P9X13_750X1100X120.stp": height 1.2, standoff 0, extent -3.75,-5.5 3.75,5.5

## BGA78C80P9X13_800X1050X120 [mm] "BGA, 0.80mm Pitch, Rect.; 78 Pin, 9 Columns X 13 Rows, 8.00mm X 10.50mm X 1.20mm H"
height 1.2
pads (78):
  round 0.4 smd: A1(-3.2,4.8) A2(-2.4,4.8) A3(-1.6,4.8) A7(1.6,4.8) A8(2.4,4.8) A9(3.2,4.8) B1(-3.2,4) B2(-2.4,4) B3(-1.6,4) B7(1.6,4) B8(2.4,4) B9(3.2,4) C1(-3.2,3.2) C2(-2.4,3.2) C3(-1.6,3.2) C7(1.6,3.2) C8(2.4,3.2) C9(3.2,3.2) D1(-3.2,2.4) D2(-2.4,2.4) D3(-1.6,2.4) D7(1.6,2.4) D8(2.4,2.4) D9(3.2,2.4) E1(-3.2,1.6) E2(-2.4,1.6) E3(-1.6,1.6) E7(1.6,1.6) E8(2.4,1.6) E9(3.2,1.6) F1(-3.2,0.8) F2(-2.4,0.8) F3(-1.6,0.8) F7(1.6,0.8) F8(2.4,0.8) F9(3.2,0.8) G1(-3.2,0) G2(-2.4,0) G3(-1.6,0) G7(1.6,0) G8(2.4,0) G9(3.2,0) H1(-3.2,-0.8) H2(-2.4,-0.8) H3(-1.6,-0.8) H7(1.6,-0.8) H8(2.4,-0.8) H9(3.2,-0.8) J1(-3.2,-1.6) J2(-2.4,-1.6) J3(-1.6,-1.6) J7(1.6,-1.6) J8(2.4,-1.6) J9(3.2,-1.6) K1(-3.2,-2.4) K2(-2.4,-2.4) K3(-1.6,-2.4) K7(1.6,-2.4) K8(2.4,-2.4) K9(3.2,-2.4) L1(-3.2,-3.2) L2(-2.4,-3.2) L3(-1.6,-3.2) L7(1.6,-3.2) L8(2.4,-3.2) L9(3.2,-3.2) M1(-3.2,-4) M2(-2.4,-4) M3(-1.6,-4) M7(1.6,-4) M8(2.4,-4) M9(3.2,-4) N1(-3.2,-4.8) N2(-2.4,-4.8) N3(-1.6,-4.8) N7(1.6,-4.8) N8(2.4,-4.8) N9(3.2,-4.8)
Top Overlay:
  circle w0.25: c-4.6,4.8 r0.125
  lines w0.2: -4,-5.35 4,-5.35 4,5.35 -4,5.35 -4,-5.35
Mechanical 14:
  lines w0.1: -4,4.25 -3,5.25 ; -4,4.35 -3.1,5.25 ; -4,4.45 -3.2,5.25 ; -4,4.55 -3.3,5.25 ; -4,4.65 -3.4,5.25 ; -4,4.75 -3.5,5.25 ; -4,4.85 -3.6,5.25 ; -4,4.95 -3.7,5.25 ; -4,5.05 -3.8,5.25 ; -4,5.15 -3.9,5.25 ; -4,-5.25 4,-5.25 4,5.25 -4,5.25 -4,-5.25
Mechanical 15:
  circle w0.05: c0,0 r0.35
  lines w0.05: -0.5,0 0.5,0 ; 0,-0.5 0,0.5 ; -5.05,-6.3 5.05,-6.3 5.05,6.3 -5.05,6.3 -5.05,-6.3
3D body "BGA78C80P9X13_800X1050X120.stp": height 1.2, standoff 0, extent -4,-5.25 4,5.25

## BGA78C80P9X13_800X1200X120 [mm] "BGA, 0.80mm Pitch, Rect.; 78 Pin, 9 Columns X 13 Rows, 8.00mm X 12.00mm X 1.20mm H"
height 1.2
pads (78):
  round 0.4 smd: A1(-3.2,4.8) A2(-2.4,4.8) A3(-1.6,4.8) A7(1.6,4.8) A8(2.4,4.8) A9(3.2,4.8) B1(-3.2,4) B2(-2.4,4) B3(-1.6,4) B7(1.6,4) B8(2.4,4) B9(3.2,4) C1(-3.2,3.2) C2(-2.4,3.2) C3(-1.6,3.2) C7(1.6,3.2) C8(2.4,3.2) C9(3.2,3.2) D1(-3.2,2.4) D2(-2.4,2.4) D3(-1.6,2.4) D7(1.6,2.4) D8(2.4,2.4) D9(3.2,2.4) E1(-3.2,1.6) E2(-2.4,1.6) E3(-1.6,1.6) E7(1.6,1.6) E8(2.4,1.6) E9(3.2,1.6) F1(-3.2,0.8) F2(-2.4,0.8) F3(-1.6,0.8) F7(1.6,0.8) F8(2.4,0.8) F9(3.2,0.8) G1(-3.2,0) G2(-2.4,0) G3(-1.6,0) G7(1.6,0) G8(2.4,0) G9(3.2,0) H1(-3.2,-0.8) H2(-2.4,-0.8) H3(-1.6,-0.8) H7(1.6,-0.8) H8(2.4,-0.8) H9(3.2,-0.8) J1(-3.2,-1.6) J2(-2.4,-1.6) J3(-1.6,-1.6) J7(1.6,-1.6) J8(2.4,-1.6) J9(3.2,-1.6) K1(-3.2,-2.4) K2(-2.4,-2.4) K3(-1.6,-2.4) K7(1.6,-2.4) K8(2.4,-2.4) K9(3.2,-2.4) L1(-3.2,-3.2) L2(-2.4,-3.2) L3(-1.6,-3.2) L7(1.6,-3.2) L8(2.4,-3.2) L9(3.2,-3.2) M1(-3.2,-4) M2(-2.4,-4) M3(-1.6,-4) M7(1.6,-4) M8(2.4,-4) M9(3.2,-4) N1(-3.2,-4.8) N2(-2.4,-4.8) N3(-1.6,-4.8) N7(1.6,-4.8) N8(2.4,-4.8) N9(3.2,-4.8)
Top Overlay:
  circle w0.25: c-4.6,4.8 r0.125
  lines w0.001: -4,-6 4,-6 4,6 -4,6 -4,-6
  lines w0.2: -4,5 -3,6 ; -4,5.2 -3.2,6 ; -4,5.4 -3.4,6 ; -4,5.6 -3.6,6 ; -4,5.8 -3.8,6 ; -4,-6 4,-6 4,6 -4,6 -4,-6
Mechanical 14:
  lines w0.1: -4,5 -3,6 ; -4,5.1 -3.1,6 ; -4,5.2 -3.2,6 ; -4,5.3 -3.3,6 ; -4,5.4 -3.4,6 ; -4,5.5 -3.5,6 ; -4,5.6 -3.6,6 ; -4,5.7 -3.7,6 ; -4,5.8 -3.8,6 ; -4,5.9 -3.9,6 ; -4,-6 4,-6 4,6 -4,6 -4,-6
Mechanical 15:
  circle w0.05: c0,0 r0.35
  lines w0.05: -0.5,0 0.5,0 ; 0,-0.5 0,0.5 ; -5.05,-7.05 5.05,-7.05 5.05,7.05 -5.05,7.05 -5.05,-7.05
3D body "BGA78C80P9X13_800X1200X120.stp": height 1.2, standoff 0, extent -4,-6 4,6

## BGA78C80P9X13_900X1050X120 [mm] "BGA, 0.80mm Pitch, Rect.; 78 Pin, 9 Columns X 13 Rows, 9.00mm X 10.50mm X 1.20mm H"
height 1.2
pads (78):
  round 0.4 smd: A1(-3.2,4.8) A2(-2.4,4.8) A3(-1.6,4.8) A7(1.6,4.8) A8(2.4,4.8) A9(3.2,4.8) B1(-3.2,4) B2(-2.4,4) B3(-1.6,4) B7(1.6,4) B8(2.4,4) B9(3.2,4) C1(-3.2,3.2) C2(-2.4,3.2) C3(-1.6,3.2) C7(1.6,3.2) C8(2.4,3.2) C9(3.2,3.2) D1(-3.2,2.4) D2(-2.4,2.4) D3(-1.6,2.4) D7(1.6,2.4) D8(2.4,2.4) D9(3.2,2.4) E1(-3.2,1.6) E2(-2.4,1.6) E3(-1.6,1.6) E7(1.6,1.6) E8(2.4,1.6) E9(3.2,1.6) F1(-3.2,0.8) F2(-2.4,0.8) F3(-1.6,0.8) F7(1.6,0.8) F8(2.4,0.8) F9(3.2,0.8) G1(-3.2,0) G2(-2.4,0) G3(-1.6,0) G7(1.6,0) G8(2.4,0) G9(3.2,0) H1(-3.2,-0.8) H2(-2.4,-0.8) H3(-1.6,-0.8) H7(1.6,-0.8) H8(2.4,-0.8) H9(3.2,-0.8) J1(-3.2,-1.6) J2(-2.4,-1.6) J3(-1.6,-1.6) J7(1.6,-1.6) J8(2.4,-1.6) J9(3.2,-1.6) K1(-3.2,-2.4) K2(-2.4,-2.4) K3(-1.6,-2.4) K7(1.6,-2.4) K8(2.4,-2.4) K9(3.2,-2.4) L1(-3.2,-3.2) L2(-2.4,-3.2) L3(-1.6,-3.2) L7(1.6,-3.2) L8(2.4,-3.2) L9(3.2,-3.2) M1(-3.2,-4) M2(-2.4,-4) M3(-1.6,-4) M7(1.6,-4) M8(2.4,-4) M9(3.2,-4) N1(-3.2,-4.8) N2(-2.4,-4.8) N3(-1.6,-4.8) N7(1.6,-4.8) N8(2.4,-4.8) N9(3.2,-4.8)
Top Overlay:
  circle w0.25: c-5.1,4.8 r0.125
  lines w0.2: -4.5,4.35 -3.5,5.35 ; -4.5,4.55 -3.7,5.35 ; -4.5,4.75 -3.9,5.35 ; -4.5,4.95 -4.1,5.35 ; -4.5,5.15 -4.3,5.35 ; -4.5,-5.35 -4.5,5.35 4.5,5.35 4.5,-5.35 -4.5,-5.35
Mechanical 14:
  lines w0.1: -4.5,4.25 -3.5,5.25 ; -4.5,4.35 -3.6,5.25 ; -4.5,4.45 -3.7,5.25 ; -4.5,4.55 -3.8,5.25 ; -4.5,4.65 -3.9,5.25 ; -4.5,4.75 -4,5.25 ; -4.5,4.85 -4.1,5.25 ; -4.5,4.95 -4.2,5.25 ; -4.5,5.05 -4.3,5.25 ; -4.5,5.15 -4.4,5.25 ; -4.5,-5.25 -4.5,5.25 4.5,5.25 4.5,-5.25 -4.5,-5.25
Mechanical 15:
  circle w0.05: c0,0 r0.35
  lines w0.05: -0.5,0 0.5,0 ; 0,-0.5 0,0.5 ; -5.55,-6.3 -5.55,6.3 5.55,6.3 5.55,-6.3 -5.55,-6.3
3D body "BGA78C80P9X13_900X1050X120.stp": height 1.2, standoff 0, extent -4.5,-5.25 4.5,5.25

## BGA78C80P9X13_900X1150X120 [mm] "BGA 0.8mm, Pitch, Square 78 Pin, 9 Columns x 13 Rows, Body 11.5mm X 9mm X 1.2mm H"
height 1.2
pads (78):
  round 0.4 smd: A1(-3.2,4.8) A2(-2.4,4.8) A3(-1.6,4.8) A7(1.6,4.8) A8(2.4,4.8) A9(3.2,4.8) B1(-3.2,4) B2(-2.4,4) B3(-1.6,4) B7(1.6,4) B8(2.4,4) B9(3.2,4) C1(-3.2,3.2) C2(-2.4,3.2) C3(-1.6,3.2) C7(1.6,3.2) C8(2.4,3.2) C9(3.2,3.2) D1(-3.2,2.4) D2(-2.4,2.4) D3(-1.6,2.4) D7(1.6,2.4) D8(2.4,2.4) D9(3.2,2.4) E1(-3.2,1.6) E2(-2.4,1.6) E3(-1.6,1.6) E7(1.6,1.6) E8(2.4,1.6) E9(3.2,1.6) F1(-3.2,0.8) F2(-2.4,0.8) F3(-1.6,0.8) F7(1.6,0.8) F8(2.4,0.8) F9(3.2,0.8) G1(-3.2,0) G2(-2.4,0) G3(-1.6,0) G7(1.6,0) G8(2.4,0) G9(3.2,0) H1(-3.2,-0.8) H2(-2.4,-0.8) H3(-1.6,-0.8) H7(1.6,-0.8) H8(2.4,-0.8) H9(3.2,-0.8) J1(-3.2,-1.6) J2(-2.4,-1.6) J3(-1.6,-1.6) J7(1.6,-1.6) J8(2.4,-1.6) J9(3.2,-1.6) K1(-3.2,-2.4) K2(-2.4,-2.4) K3(-1.6,-2.4) K7(1.6,-2.4) K8(2.4,-2.4) K9(3.2,-2.4) L1(-3.2,-3.2) L2(-2.4,-3.2) L3(-1.6,-3.2) L7(1.6,-3.2) L8(2.4,-3.2) L9(3.2,-3.2) M1(-3.2,-4) M2(-2.4,-4) M3(-1.6,-4) M7(1.6,-4) M8(2.4,-4) M9(3.2,-4) N1(-3.2,-4.8) N2(-2.4,-4.8) N3(-1.6,-4.8) N7(1.6,-4.8) N8(2.4,-4.8) N9(3.2,-4.8)
Top Overlay:
  circle w0.25: c-5.1,4.8 r0.125
  lines w0.2: -4.5,4.75 -3.5,5.75 ; -4.5,4.95 -3.7,5.75 ; -4.5,5.15 -3.9,5.75 ; -4.5,5.35 -4.1,5.75 ; -4.5,5.55 -4.3,5.75 ; -4.5,-5.75 -4.5,5.75 4.5,5.75 4.5,-5.75 -4.5,-5.75
Mechanical 14:
  lines w0.1: -4.5,4.75 -3.5,5.75 ; -4.5,4.85 -3.6,5.75 ; -4.5,4.95 -3.7,5.75 ; -4.5,5.05 -3.8,5.75 ; -4.5,5.15 -3.9,5.75 ; -4.5,5.25 -4,5.75 ; -4.5,5.35 -4.1,5.75 ; -4.5,5.45 -4.2,5.75 ; -4.5,5.55 -4.3,5.75 ; -4.5,5.65 -4.4,5.75 ; -4.5,-5.75 4.5,-5.75 4.5,5.75 -4.5,5.75 -4.5,-5.75
  text "9" at 3.075,6.075 h0.4
  text "8" at 2.275,6.075 h0.4
  text "7" at 1.475,6.075 h0.4
  text "3" at -1.725,6.075 h0.4
  text "2" at -2.525,6.075 h0.4
  text "1" at -3.325,6.075 h0.4
  text "J" at -4,-1.8 h0.4
  text "N" at -4,-5 h0.4
  text "A" at -4,4.6 h0.4
  text "B" at -4,3.8 h0.4
  text "C" at -4,3 h0.4
  text "D" at -4,2.2 h0.4
  text "E" at -4,1.4 h0.4
  text "F" at -4,0.6 h0.4
  text "G" at -4,-0.2 h0.4
  text "H" at -4,-1 h0.4
  text "M" at -4,-4.2 h0.4
  text "K" at -4,-2.6 h0.4
  text "L" at -4,-3.4 h0.4
Mechanical 15:
  lines w0.05: -0.5,0 0.5,0 ; 0,-0.5 0,0.5 ; -5.5,-6.75 5.5,-6.75 5.5,6.75 -5.5,6.75 -5.5,-6.75
3D body "BGA78C80P9X13_900X1150X120.stp": height 1.2, standoff -0.05, extent -4.5,-5.75 4.5,5.75

## BGA78C80P9X13_900X1320X120 [mm] "BGA 0.8mm, Pitch, Square 78 Pin, 9 Columns x 13 Rows, Body 13.2mm X 9mm X 1.2mm H"
height 1.2
pads (78):
  round 0.4 smd: A1(-3.2,4.8) A2(-2.4,4.8) A3(-1.6,4.8) A7(1.6,4.8) A8(2.4,4.8) A9(3.2,4.8) B1(-3.2,4) B2(-2.4,4) B3(-1.6,4) B7(1.6,4) B8(2.4,4) B9(3.2,4) C1(-3.2,3.2) C2(-2.4,3.2) C3(-1.6,3.2) C7(1.6,3.2) C8(2.4,3.2) C9(3.2,3.2) D1(-3.2,2.4) D2(-2.4,2.4) D3(-1.6,2.4) D7(1.6,2.4) D8(2.4,2.4) D9(3.2,2.4) E1(-3.2,1.6) E2(-2.4,1.6) E3(-1.6,1.6) E7(1.6,1.6) E8(2.4,1.6) E9(3.2,1.6) F1(-3.2,0.8) F2(-2.4,0.8) F3(-1.6,0.8) F7(1.6,0.8) F8(2.4,0.8) F9(3.2,0.8) G1(-3.2,0) G2(-2.4,0) G3(-1.6,0) G7(1.6,0) G8(2.4,0) G9(3.2,0) H1(-3.2,-0.8) H2(-2.4,-0.8) H3(-1.6,-0.8) H7(1.6,-0.8) H8(2.4,-0.8) H9(3.2,-0.8) J1(-3.2,-1.6) J2(-2.4,-1.6) J3(-1.6,-1.6) J7(1.6,-1.6) J8(2.4,-1.6) J9(3.2,-1.6) K1(-3.2,-2.4) K2(-2.4,-2.4) K3(-1.6,-2.4) K7(1.6,-2.4) K8(2.4,-2.4) K9(3.2,-2.4) L1(-3.2,-3.2) L2(-2.4,-3.2) L3(-1.6,-3.2) L7(1.6,-3.2) L8(2.4,-3.2) L9(3.2,-3.2) M1(-3.2,-4) M2(-2.4,-4) M3(-1.6,-4) M7(1.6,-4) M8(2.4,-4) M9(3.2,-4) N1(-3.2,-4.8) N2(-2.4,-4.8) N3(-1.6,-4.8) N7(1.6,-4.8) N8(2.4,-4.8) N9(3.2,-4.8)
Top Overlay:
  circle w0.25: c-5.1,5.7 r0.125
  lines w0.2: -4.5,5.65 -3.5,6.65 ; -4.5,5.85 -3.7,6.65 ; -4.5,6.05 -3.9,6.65 ; -4.5,6.25 -4.1,6.65 ; -4.5,6.45 -4.3,6.65 ; -4.5,-6.65 -4.5,6.65 4.5,6.65 4.5,-6.65 -4.5,-6.65
Mechanical 14:
  lines w0.1: -4.5,5.65 -3.5,6.65 ; -4.5,5.75 -3.6,6.65 ; -4.5,5.85 -3.7,6.65 ; -4.5,5.95 -3.8,6.65 ; -4.5,6.05 -3.9,6.65 ; -4.5,6.15 -4,6.65 ; -4.5,6.25 -4.1,6.65 ; -4.5,6.35 -4.2,6.65 ; -4.5,6.45 -4.3,6.65 ; -4.5,6.55 -4.4,6.65 ; -4.5,-6.65 -4.5,6.65 4.5,6.65 4.5,-6.65 -4.5,-6.65
  text "9" at 3.075,6.975 h0.4
  text "8" at 2.275,6.975 h0.4
  text "7" at 1.475,6.975 h0.4
  text "3" at -1.725,6.975 h0.4
  text "2" at -2.525,6.975 h0.4
  text "1" at -3.325,6.975 h0.4
  text "J" at -4,-1.8 h0.4
  text "N" at -4,-5 h0.4
  text "A" at -4,4.6 h0.4
  text "B" at -4,3.8 h0.4
  text "C" at -4,3 h0.4
  text "D" at -4,2.2 h0.4
  text "E" at -4,1.4 h0.4
  text "F" at -4,0.6 h0.4
  text "G" at -4,-0.2 h0.4
  text "H" at -4,-1 h0.4
  text "M" at -4,-4.2 h0.4
  text "K" at -4,-2.6 h0.4
  text "L" at -4,-3.4 h0.4
Mechanical 15:
  lines w0.05: -0.5,0 0.5,0 ; 0,-0.5 0,0.5 ; -5.5,-7.65 5.5,-7.65 5.5,7.65 -5.5,7.65 -5.5,-7.65
3D body "BGA78C80P9X13_900X1320X120.stp": height 1.2, standoff -0.05, extent -4.5,-6.65 4.5,6.65

## BGA78C80P9X13_950X1300X120 [mm] "BGA, 0.80mm Pitch, Rect.; 78 Pin, 9 Columns X 13 Rows, 9.50mm X 13.00mm X 1.20mm H"
height 1.2
pads (78):
  round 0.4 smd: A1(-3.2,4.8) A2(-2.4,4.8) A3(-1.6,4.8) A7(1.6,4.8) A8(2.4,4.8) A9(3.2,4.8) B1(-3.2,4) B2(-2.4,4) B3(-1.6,4) B7(1.6,4) B8(2.4,4) B9(3.2,4) C1(-3.2,3.2) C2(-2.4,3.2) C3(-1.6,3.2) C7(1.6,3.2) C8(2.4,3.2) C9(3.2,3.2) D1(-3.2,2.4) D2(-2.4,2.4) D3(-1.6,2.4) D7(1.6,2.4) D8(2.4,2.4) D9(3.2,2.4) E1(-3.2,1.6) E2(-2.4,1.6) E3(-1.6,1.6) E7(1.6,1.6) E8(2.4,1.6) E9(3.2,1.6) F1(-3.2,0.8) F2(-2.4,0.8) F3(-1.6,0.8) F7(1.6,0.8) F8(2.4,0.8) F9(3.2,0.8) G1(-3.2,0) G2(-2.4,0) G3(-1.6,0) G7(1.6,0) G8(2.4,0) G9(3.2,0) H1(-3.2,-0.8) H2(-2.4,-0.8) H3(-1.6,-0.8) H7(1.6,-0.8) H8(2.4,-0.8) H9(3.2,-0.8) J1(-3.2,-1.6) J2(-2.4,-1.6) J3(-1.6,-1.6) J7(1.6,-1.6) J8(2.4,-1.6) J9(3.2,-1.6) K1(-3.2,-2.4) K2(-2.4,-2.4) K3(-1.6,-2.4) K7(1.6,-2.4) K8(2.4,-2.4) K9(3.2,-2.4) L1(-3.2,-3.2) L2(-2.4,-3.2) L3(-1.6,-3.2) L7(1.6,-3.2) L8(2.4,-3.2) L9(3.2,-3.2) M1(-3.2,-4) M2(-2.4,-4) M3(-1.6,-4) M7(1.6,-4) M8(2.4,-4) M9(3.2,-4) N1(-3.2,-4.8) N2(-2.4,-4.8) N3(-1.6,-4.8) N7(1.6,-4.8) N8(2.4,-4.8) N9(3.2,-4.8)
Top Overlay:
  circle w0.25: c-5.35,4.8 r0.125
  lines w0.001: -4.75,-6.5 -4.75,6.5 4.75,6.5 4.75,-6.5 -4.75,-6.5
  lines w0.2: -4.75,5.5 -3.75,6.5 ; -4.75,5.7 -3.95,6.5 ; -4.75,5.9 -4.15,6.5 ; -4.75,6.1 -4.35,6.5 ; -4.75,6.3 -4.55,6.5 ; -4.75,-6.5 -4.75,6.5 4.75,6.5 4.75,-6.5 -4.75,-6.5
Mechanical 14:
  lines w0.1: -4.75,5.5 -3.75,6.5 ; -4.75,5.6 -3.85,6.5 ; -4.75,5.7 -3.95,6.5 ; -4.75,5.8 -4.05,6.5 ; -4.75,5.9 -4.15,6.5 ; -4.75,6 -4.25,6.5 ; -4.75,6.1 -4.35,6.5 ; -4.75,6.2 -4.45,6.5 ; -4.75,6.3 -4.55,6.5 ; -4.75,6.4 -4.65,6.5 ; -4.75,-6.5 -4.75,6.5 4.75,6.5 4.75,-6.5 -4.75,-6.5
Mechanical 15:
  circle w0.05: c0,0 r0.35
  lines w0.05: -0.5,0 0.5,0 ; 0,-0.5 0,0.5 ; -5.8,-7.55 -5.8,7.55 5.8,7.55 5.8,-7.55 -5.8,-7.55
3D body "BGA78C80P9X13_950X1300X120.stp": height 1.2, standoff 0, extent -4.75,-6.5 4.75,6.5